# Altium footprint library PcbLib.PcbLib: 71 footprints (part 2 of 5)
Each footprint in its own frame and in the unit in brackets; x right, y up, seen from the top. Pads: shape width x height; smd on the part's side, far side on the other; paste and mask are expansions set on the pad; w line width, h text height; cw(c..) or ccw(c..) is an arc to the next point about the centre after c.
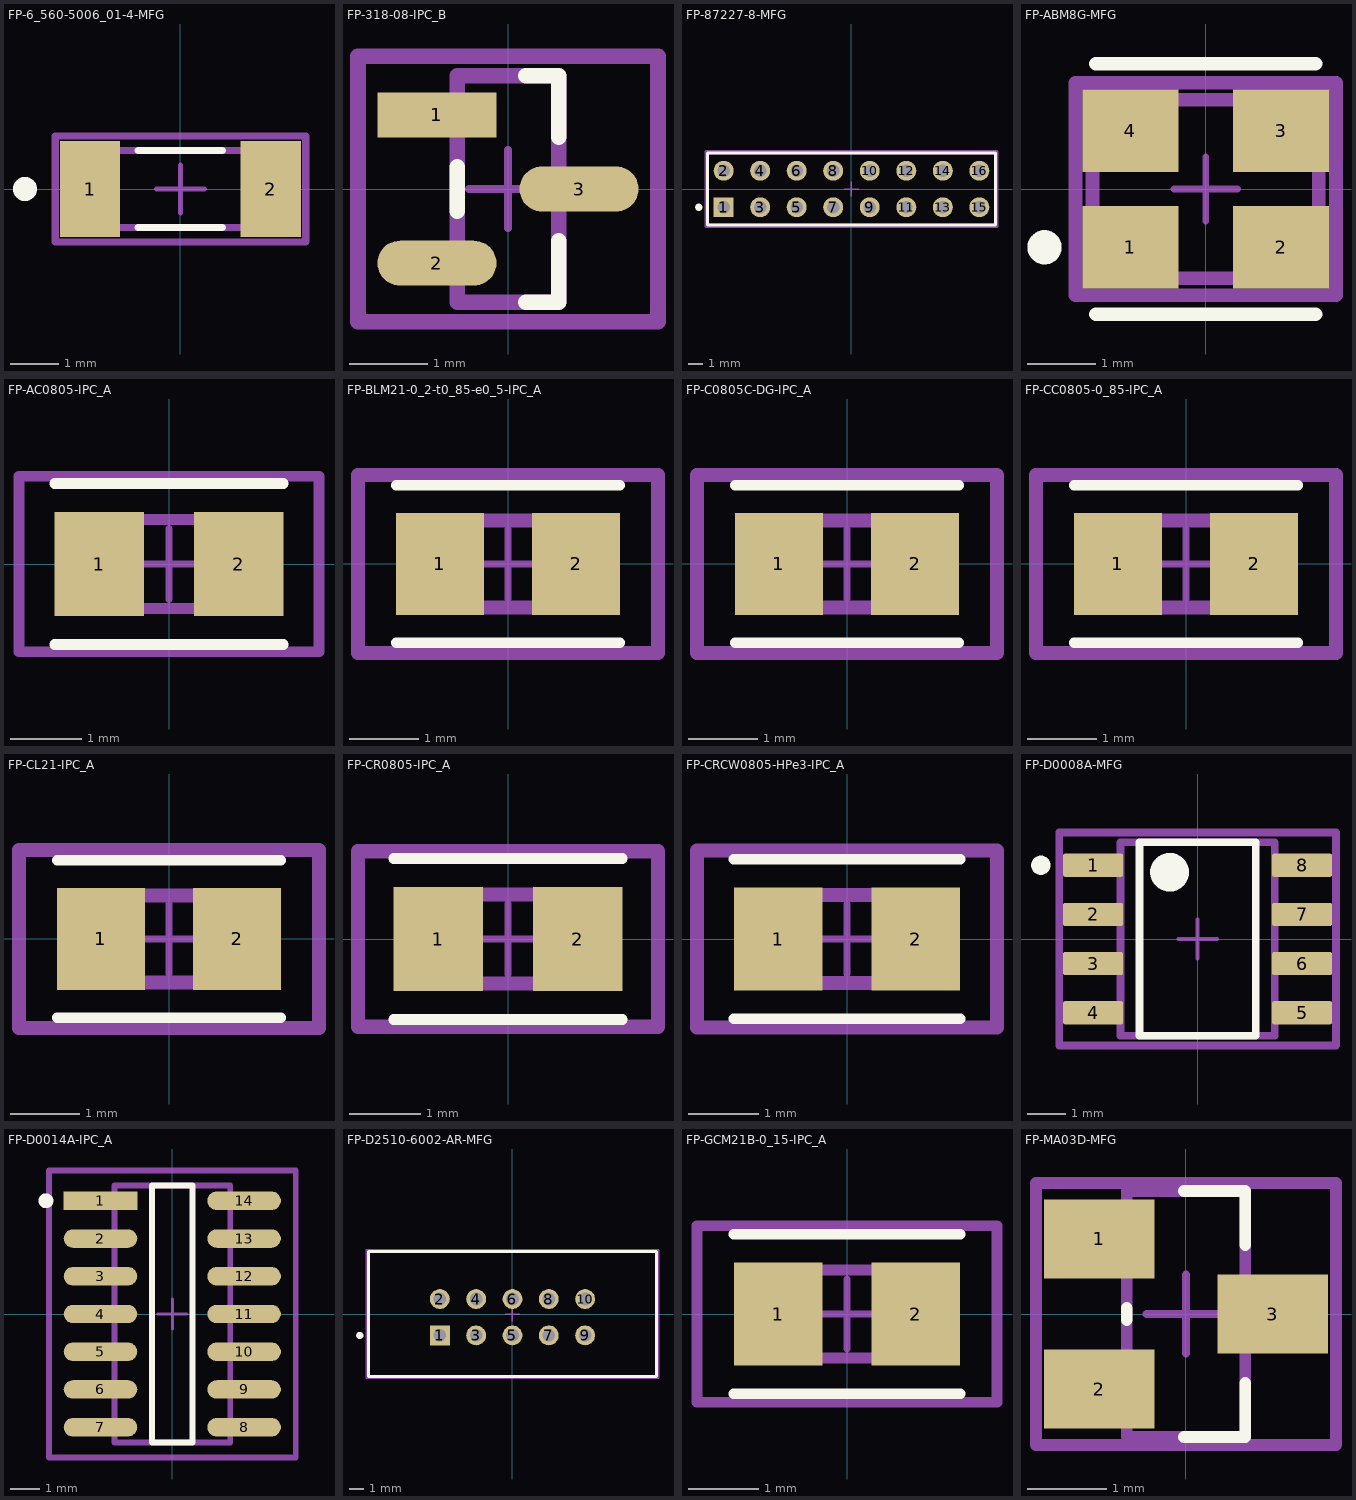
[diagram p1: the footprints below, top view; thin cyan lines are the x and y axes]

## FP-6_560-5006_01-4-MFG [mm]
pads (2):
  rect 1.25x2 smd paste+0 mask+0: 1(-1.875,0) 2(1.875,0)
Top Overlay:
  circle w0.25: c-3.225,0 r0.125
  lines w0.15: -0.875,-0.8 0.875,-0.8 ; -0.875,0.8 0.875,0.8
Top Value:
  text ".Value" at -1.512,-0.394 h1.25
Top 3D Body:
  lines w0.15: -1.85,-0.8 1.85,-0.8 1.85,0.8 -1.85,0.8 -1.85,-0.8
Top Courtyard:
  lines w0.15: -2.6,-1.1 2.6,-1.1 2.6,1.1 -2.6,1.1 -2.6,-1.1
Top Assembly:
  lines w0.15: -2.6,-1.1 2.6,-1.1 2.6,1.1 -2.6,1.1 -2.6,-1.1
  text ".Value" at 0,0.011 h1
Top Component Center:
  lines w0.1: -0.5,0 0.5,0 ; 0,-0.5 0,0.5
3D body "Diode_Vishay_Semiconductor_Diodes_Division_LS4148-GS08_eec.STEP": height 0.25, standoff 0, extent -2.6,-1.1 2.6,1.1

## FP-318-08-IPC_B [mm]
height 5.27
pads (3):
  rect 1.524x0.578 smd paste+0 mask+0: 1(-0.91,0.95)
  rrect100% 1.524x0.578 smd paste+0 mask+0: 2(-0.91,-0.95) 3(0.91,0)
Top Overlay:
  lines w0.2: -0.65,-0.286 -0.65,0.286 ; 0.227,-1.45 0.65,-1.45 0.65,-0.664 ; 0.227,1.45 0.65,1.45 0.65,0.664
Top Value:
  text ".Value" at -1.512,1.892 h1.25
Top 3D Body:
  lines w0.2: -0.65,-1.45 0.65,-1.45 0.65,1.45 -0.65,1.45 -0.65,-1.45
Top Courtyard:
  lines w0.2: -1.922,-1.7 1.922,-1.7 1.922,1.7 -1.922,1.7 -1.922,-1.7
Top Assembly:
  lines w0.2: -1.922,-1.7 1.922,-1.7 1.922,1.7 -1.922,1.7 -1.922,-1.7
  text ".Designator" at 0,0.188 h1
Top Component Center:
  lines w0.1: -0.5,0 0.5,0 ; 0,-0.5 0,0.5
3D body "IC_ON_Semiconductor_NUD3112LT1G_eec.STEP": height 0.25, standoff 0, extent -1.922,-1.7 1.922,1.7

## FP-87227-8-MFG [mil]
height 207.48
pads (16):
  rect 54.69x54.69 hole 35 paste-39370.1 mask+0: 1(-350,-50)
  round 54.69 hole 35 paste-39370.1 mask+0: 2(-350,50) 3(-250,-50) 4(-250,50) 5(-150,-50) 6(-150,50) 7(-50,-50) 8(-50,50) 9(50,-50) 10(50,50) 11(150,-50) 12(150,50) 13(250,-50) 14(250,50) 15(350,-50) 16(350,50)
Top Overlay:
  circle w9.84: c-418.12,-50 r4.92
  lines w7.87: -394.5,-98.5 394.5,-98.5 394.5,98.5 -394.5,98.5 -394.5,-98.5
Top 3D Body:
  lines w7.87: -394.5,-98.5 394.5,-98.5 394.5,98.5 -394.5,98.5 -394.5,-98.5
Top Courtyard:
  lines w7.87: -398.44,-102.44 398.44,-102.44 398.44,102.44 -398.44,102.44 -398.44,-102.44
Top Assembly:
  lines w7.87: -398.44,-102.44 398.44,-102.44 398.44,102.44 -398.44,102.44 -398.44,-102.44
  text ".Designator" at 0,7.41 h39.37
Top Component Center:
  lines w3.94: -19.68,0 19.68,0 ; 0,-19.68 0,19.68
3D body "Conn_TE_Connectivity_87227-8_eec.STEP": height 10, standoff 0, extent -398.44,-102.44 398.44,102.44

## FP-ABM8G-MFG [mm]
pads (4):
  rect 1.4x1.2 smd paste+0 mask+0: 1(-1.1,-0.85) 2(1.1,-0.85) 3(1.1,0.85) 4(-1.1,0.85)
Top Overlay:
  circle w0.25: c-2.35,-0.85 r0.125
  lines w0.2: -1.6,-1.825 1.6,-1.825 ; -1.6,1.825 1.6,1.825
Top 3D Body:
  lines w0.2: -1.65,-1.3 1.65,-1.3 1.65,1.3 -1.65,1.3 -1.65,-1.3
Top Courtyard:
  lines w0.2: -1.9,-1.55 1.9,-1.55 1.9,1.55 -1.9,1.55 -1.9,-1.55
Top Assembly:
  lines w0.2: -1.9,-1.55 1.9,-1.55 1.9,1.55 -1.9,1.55 -1.9,-1.55
  text ".Designator" at 0,0.188 h1
Top Component Center:
  lines w0.1: -0.465,0 0.465,0 ; 0,-0.465 0,0.465
3D body "Crys_Abracon_ABM8G-25_000MHz-B4Y-T_eec.STEP": height 0.25, standoff 0, extent -1.9,-1.55 1.9,1.55

## FP-AC0805-IPC_A [mm]
pads (2):
  rect 1.258x1.462 smd paste+0 mask+0: 1(-0.977,0) 2(0.977,0)
Top Overlay:
  lines w0.15: -1.606,-1.131 1.606,-1.131 ; -1.606,1.131 1.606,1.131
Top Value:
  text ".Value" at -1.512,-0.394 h1.25
Top 3D Body:
  lines w0.15: -1,-0.625 -1,0.625 1,0.625 1,-0.625 -1,-0.625
Top Courtyard:
  lines w0.15: -2.106,-1.231 -2.106,1.231 2.106,1.231 2.106,-1.231 -2.106,-1.231
Top Assembly:
  lines w0.15: -2.106,-1.231 -2.106,1.231 2.106,1.231 2.106,-1.231 -2.106,-1.231
  text ".Value" at 0,0.011 h1
Top Component Center:
  lines w0.1: -0.5,0 0.5,0 ; 0,-0.5 0,0.5
3D body "Res_Yageo_AC0805FR-074R22L_eec.STEP": height 0.25, standoff 0, extent -2.106,-1.231 2.106,1.231

## FP-BLM21-0_2-t0_85-e0_5-IPC_A [mm]
pads (2):
  rect 1.258x1.462 smd paste+0 mask+0: 1(-0.977,0) 2(0.977,0)
Top Overlay:
  lines w0.15: -1.606,-1.131 1.606,-1.131 ; -1.606,1.131 1.606,1.131
Top Value:
  text ".Value" at -1.512,-0.394 h1.25
Top 3D Body:
  lines w0.2: -1,-0.625 1,-0.625 1,0.625 -1,0.625 -1,-0.625
Top Courtyard:
  lines w0.2: -2.153,-1.278 2.153,-1.278 2.153,1.278 -2.153,1.278 -2.153,-1.278
Top Assembly:
  lines w0.2: -2.153,-1.278 2.153,-1.278 2.153,1.278 -2.153,1.278 -2.153,-1.278
  text ".Value" at 0,0.011 h1
Top Component Center:
  lines w0.1: -0.5,0 0.5,0 ; 0,-0.5 0,0.5
3D body "FBead_Murata_BLM21AG102SN1D_eec.STEP": height 1.05, standoff 0, extent -1,-0.625 1,0.625

## FP-C0805C-DG-IPC_A [mm]
pads (2):
  rect 1.258x1.462 smd paste+0 mask+0: 1(-0.977,0) 2(0.977,0)
Top Overlay:
  lines w0.15: -1.606,-1.131 1.606,-1.131 ; -1.606,1.131 1.606,1.131
Top Value:
  text ".Value" at -1.512,-0.394 h1.25
Top 3D Body:
  lines w0.2: -1,-0.625 -1,0.625 1,0.625 1,-0.625 -1,-0.625
Top Courtyard:
  lines w0.2: -2.153,-1.278 -2.153,1.278 2.153,1.278 2.153,-1.278 -2.153,-1.278
Top Assembly:
  lines w0.2: -2.153,-1.278 -2.153,1.278 2.153,1.278 2.153,-1.278 -2.153,-1.278
  text ".Value" at 0,0.011 h1
Top Component Center:
  lines w0.1: -0.5,0 0.5,0 ; 0,-0.5 0,0.5
3D body "Cap_Kemet_C0805C106K8PACTU_eec.STEP": height 1.4, standoff 0, extent -1,-0.625 1,0.625

## FP-CC0805-0_85-IPC_A [mm]
pads (2):
  rect 1.258x1.462 smd paste+0 mask+0: 1(-0.977,0) 2(0.977,0)
Top Overlay:
  lines w0.15: -1.606,-1.131 1.606,-1.131 ; -1.606,1.131 1.606,1.131
Top Value:
  text ".Value" at -1.512,-0.394 h1.25
Top 3D Body:
  lines w0.2: -1,-0.625 -1,0.625 1,0.625 1,-0.625 -1,-0.625
Top Courtyard:
  lines w0.2: -2.153,-1.278 -2.153,1.278 2.153,1.278 2.153,-1.278 -2.153,-1.278
Top Assembly:
  lines w0.2: -2.153,-1.278 -2.153,1.278 2.153,1.278 2.153,-1.278 -2.153,-1.278
  text ".Value" at 0,0.011 h1
Top Component Center:
  lines w0.1: -0.5,0 0.5,0 ; 0,-0.5 0,0.5
3D body "Cap_Yageo_CC0805KKX7R7BB105_eec.STEP": height 0.25, standoff 0, extent -2.153,-1.278 2.153,1.278

## FP-CL21-IPC_A [mm]
pads (2):
  rect 1.258x1.462 smd paste+0 mask+0: 1(-0.977,0) 2(0.977,0)
Top Overlay:
  lines w0.15: -1.606,-1.131 1.606,-1.131 ; -1.606,1.131 1.606,1.131
Top Value:
  text ".Value" at -1.512,-0.394 h1.25
Top 3D Body:
  lines w0.2: -1,-0.625 -1,0.625 1,0.625 1,-0.625 -1,-0.625
Top Courtyard:
  lines w0.2: -2.153,-1.278 -2.153,1.278 2.153,1.278 2.153,-1.278 -2.153,-1.278
Top Assembly:
  lines w0.2: -2.153,-1.278 -2.153,1.278 2.153,1.278 2.153,-1.278 -2.153,-1.278
  text ".Value" at 0,0.011 h1
Top Component Center:
  lines w0.1: -0.5,0 0.5,0 ; 0,-0.5 0,0.5
3D body "Cap_Samsung_CL21B273KBANNNC_eec.STEP": height 1.45, standoff 0, extent -1,-0.625 1,0.625

## FP-CR0805-IPC_A [mm]
pads (2):
  rect 1.258x1.462 smd paste+0 mask+0: 1(-0.977,0) 2(0.977,0)
Top Overlay:
  lines w0.15: -1.606,-1.131 1.606,-1.131 ; -1.606,1.131 1.606,1.131
Top Value:
  text ".Value" at -1.512,-0.394 h1.25
Top 3D Body:
  lines w0.2: -1,-0.625 1,-0.625 1,0.625 -1,0.625 -1,-0.625
Top Courtyard:
  lines w0.2: -2.106,-1.231 2.106,-1.231 2.106,1.231 -2.106,1.231 -2.106,-1.231
Top Assembly:
  lines w0.2: -2.106,-1.231 2.106,-1.231 2.106,1.231 -2.106,1.231 -2.106,-1.231
  text ".Value" at 0,0.011 h1
Top Component Center:
  lines w0.1: -0.5,0 0.5,0 ; 0,-0.5 0,0.5
3D body "Res_Bourns_CR0805AFW-22R1EAS_eec.STEP": height 0.25, standoff 0, extent -2.106,-1.231 2.106,1.231

## FP-CRCW0805-HPe3-IPC_A [mm]
height 5.27
pads (2):
  rect 1.258x1.462 smd paste+0 mask+0: 1(-0.977,0) 2(0.977,0)
Top Overlay:
  lines w0.15: -1.606,-1.131 1.606,-1.131 ; -1.606,1.131 1.606,1.131
Top Value:
  text ".Value" at -1.512,-0.394 h1.25
Top 3D Body:
  lines w0.2: -1,-0.625 -1,0.625 1,0.625 1,-0.625 -1,-0.625
Top Courtyard:
  lines w0.2: -2.129,-1.254 -2.129,1.254 2.129,1.254 2.129,-1.254 -2.129,-1.254
Top Assembly:
  lines w0.2: -2.129,-1.254 -2.129,1.254 2.129,1.254 2.129,-1.254 -2.129,-1.254
  text ".Value" at 0,0.011 h1
Top Component Center:
  lines w0.1: -0.5,0 0.5,0 ; 0,-0.5 0,0.5
3D body "Res_Vishay_CRCW08053R00FKEAHP_eec.STEP": height 0.25, standoff 0, extent -2.129,-1.254 2.129,1.254

## FP-D0008A-MFG [mm]
height 5.27
pads (8):
  rrect17% 1.55x0.6 smd paste+0 mask+0: 1(-2.7,1.905) 2(-2.7,0.635) 3(-2.7,-0.635) 4(-2.7,-1.905) 5(2.7,-1.905) 6(2.7,-0.635) 7(2.7,0.635) 8(2.7,1.905)
Top Overlay:
  circle w0.25: c-4.05,1.905 r0.125
  circle w0.5: c-0.725,1.725 r0.25
  lines w0.2: -1.5,-2.5 1.5,-2.5 1.5,2.5 -1.5,2.5 -1.5,-2.5
Top Value:
  text ".Value" at -0.394,1.512 h1.25
Top 3D Body:
  lines w0.2: -1.99,-2.5 1.99,-2.5 1.99,2.5 -1.99,2.5 -1.99,-2.5
Top Courtyard:
  lines w0.2: -3.575,-2.75 3.575,-2.75 3.575,2.75 -3.575,2.75 -3.575,-2.75
Top Assembly:
  lines w0.2: -3.575,-2.75 3.575,-2.75 3.575,2.75 -3.575,2.75 -3.575,-2.75
  text ".Designator" at 0,0.188 h1
Top Component Center:
  lines w0.1: -0.5,0 0.5,0 ; 0,-0.5 0,0.5
3D body "IC_Texas_Instruments_ISO7220ADR_eec.STEP": height 0.25, standoff 0, extent -3.575,-2.75 3.575,2.75

## FP-D0014A-IPC_A [mm]
pads (14):
  rect 2.474x0.622 smd paste+0 mask+0: 1(-2.416,3.81)
  rrect100% 2.474x0.622 smd paste+0 mask+0: 2(-2.416,2.54) 3(-2.416,1.27) 4(-2.416,0) 5(-2.416,-1.27) 6(-2.416,-2.54) 7(-2.416,-3.81) 8(2.416,-3.81) 9(2.416,-2.54) 10(2.416,-1.27) 11(2.416,0) 12(2.416,1.27) 13(2.416,2.54) 14(2.416,3.81)
Top Overlay:
  circle w0.25: c-4.25,3.81 r0.125
  lines w0.2: -0.679,-4.325 0.679,-4.325 0.679,4.325 -0.679,4.325 -0.679,-4.325
Top Value:
  text ".Value" at -0.473,1.814 h1.5
Top 3D Body:
  lines w0.2: -1.95,-4.325 1.95,-4.325 1.95,4.325 -1.95,4.325 -1.95,-4.325
Top Courtyard:
  lines w0.2: -4.153,-4.825 4.153,-4.825 4.153,4.825 -4.153,4.825 -4.153,-4.825
Top Assembly:
  lines w0.2: -4.153,-4.825 4.153,-4.825 4.153,4.825 -4.153,4.825 -4.153,-4.825
  text ".Designator" at 0,0.188 h1
Top Component Center:
  lines w0.1: -0.5,0 0.5,0 ; 0,-0.5 0,0.5
3D body "IC_Texas_Instruments_OPA4191IDR_eec.STEP": height 0.25, standoff 0, extent -4.153,-4.825 4.153,4.825

## FP-D2510-6002-AR-MFG [mm]
pads (10):
  rect 1.39x1.39 hole 0.89 paste-1000 mask+0: 1(-5.08,-1.495)
  round 1.39 hole 0.89 paste-1000 mask+0: 2(-5.08,1.045) 3(-2.54,-1.495) 4(-2.54,1.045) 5(0,-1.495) 6(0,1.045) 7(2.54,-1.495) 8(2.54,1.045) 9(5.08,-1.495) 10(5.08,1.045)
Top Overlay:
  circle w0.25: c-10.675,-1.495 r0.125
  lines w0.2: -10.075,-4.36 -10.075,4.36 10.075,4.36 10.075,-4.36 -10.075,-4.36
Top 3D Body:
  lines w0.2: -10.075,-4.36 -10.075,4.36 10.075,4.36 10.075,-4.36 -10.075,-4.36
Top Courtyard:
  lines w0.2: -10.175,-4.46 -10.175,4.46 10.175,4.46 10.175,-4.46 -10.175,-4.46
Top Assembly:
  lines w0.2: -10.175,-4.46 -10.175,4.46 10.175,4.46 10.175,-4.46 -10.175,-4.46
  text ".Designator" at 0,0.188 h1
Top Component Center:
  lines w0.1: -0.5,0 0.5,0 ; 0,-0.5 0,0.5
3D body "Conn_3M_D2510-6002-AR_eec.STEP": height 0.25, standoff 0, extent -10.175,-4.46 10.175,4.46

## FP-GCM21B-0_15-IPC_A [mm]
height 1.4
pads (2):
  rect 1.258x1.462 smd paste+0 mask+0: 1(-0.977,0) 2(0.977,0)
Top Overlay:
  lines w0.15: -1.606,-1.131 1.606,-1.131 ; -1.606,1.131 1.606,1.131
Top Value:
  text ".Value" at -1.512,-0.394 h1.25
Top 3D Body:
  lines w0.15: -1,-0.625 -1,0.625 1,0.625 1,-0.625 -1,-0.625
Top Courtyard:
  lines w0.15: -2.129,-1.254 -2.129,1.254 2.129,1.254 2.129,-1.254 -2.129,-1.254
Top Assembly:
  lines w0.15: -2.129,-1.254 -2.129,1.254 2.129,1.254 2.129,-1.254 -2.129,-1.254
  text ".Value" at 0,0.011 h1
Top Component Center:
  lines w0.1: -0.5,0 0.5,0 ; 0,-0.5 0,0.5
3D body "Cap_Murata_GCM21BR72A104KA37L_eec.STEP": height 0.25, standoff 0, extent -2.129,-1.254 2.129,1.254

## FP-MA03D-MFG [mm]
height 1.5
pads (3):
  rect 1.4x1 smd paste+0 mask+0: 1(-1.1,0.95) 2(-1.1,-0.95) 3(1.1,0)
Top Overlay:
  lines w0.15: -0.75,-0.075 -0.75,0.075 ; -0.025,-1.56 0.75,-1.56 0.75,-0.875 ; -0.025,1.56 0.75,1.56 0.75,0.875
Top Value:
  text ".Value" at -1.639,1.892 h1.25
Top 3D Body:
  lines w0.15: -0.75,-1.56 -0.75,1.56 0.75,1.56 0.75,-1.56 -0.75,-1.56
Top Courtyard:
  lines w0.15: -1.9,-1.66 -1.9,1.66 1.9,1.66 1.9,-1.66 -1.9,-1.66
Top Assembly:
  lines w0.15: -1.9,-1.66 -1.9,1.66 1.9,1.66 1.9,-1.66 -1.9,-1.66
  text ".Designator" at 0,0.188 h1
Top Component Center:
  lines w0.1: -0.5,0 0.5,0 ; 0,-0.5 0,0.5
3D body "Diode_ON_Semiconductor_BAT54C_eec.STEP": height 1.2, standoff 0, extent -1.2,-1.46 1.2,1.46